# Altium footprint library Molex FFC - FPC Connectors (Through-Hole).PcbLib: 219 footprints (part 10 of 14)
Each footprint in its own frame and in the unit in brackets; x right, y up, seen from the top. Pads: shape width x height; smd on the part's side, far side on the other; paste and mask are expansions set on the pad; w line width, h text height; cw(c..) or ccw(c..) is an arc to the next point about the centre after c.
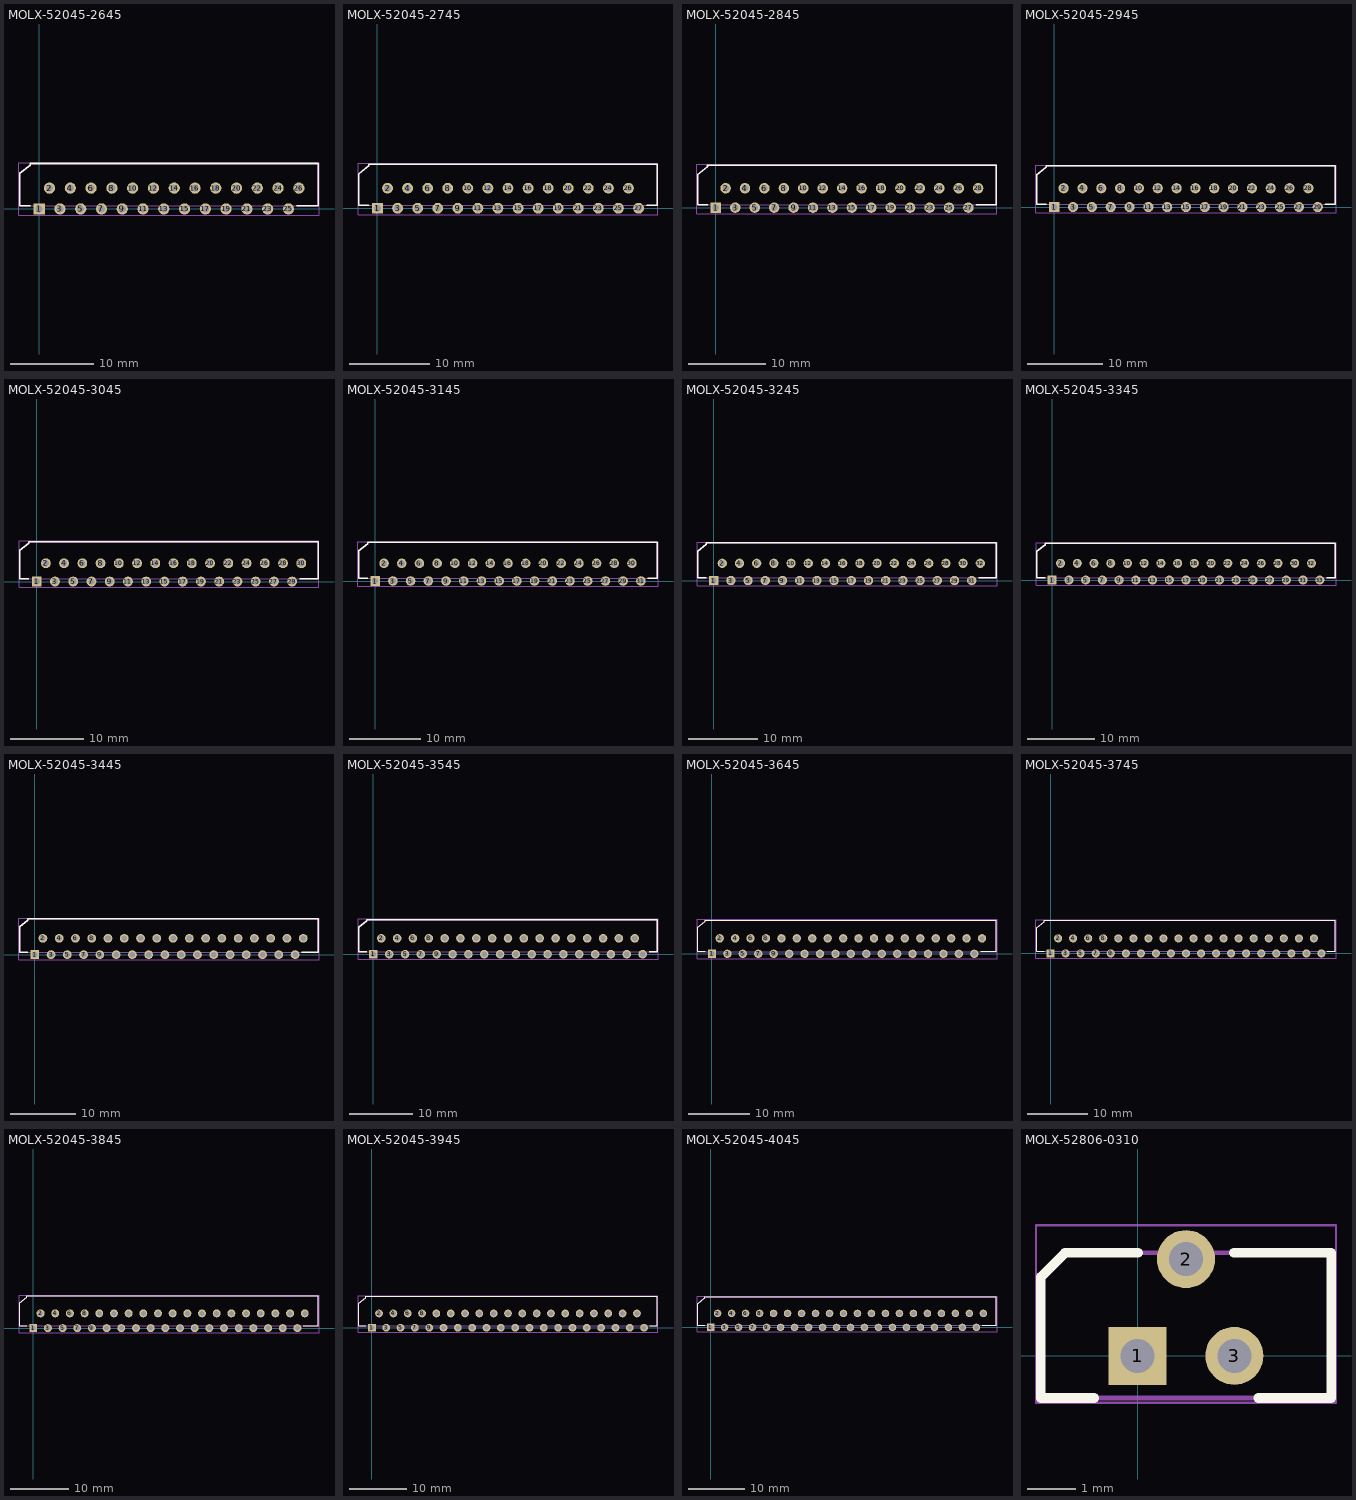
[diagram p9: the footprints below, top view; thin cyan lines are the x and y axes]

## MOLX-52045-2645 [mm] "FFC Connector, 26-Leads, Vertical, Pitch 1.25 mm, Mated Height 8.0 mm, Through Hole"
height 8.012
pads (26):
  rect 1.35x1.35 hole 0.85: 1(0,0)
  round 1.35 hole 0.85: 2(1.25,2.5) 3(2.5,0) 4(3.75,2.5) 5(5,0) 6(6.25,2.5) 7(7.5,0) 8(8.75,2.5) 9(10,0) 10(11.25,2.5) 11(12.5,0) 12(13.75,2.5) 13(15,0) 14(16.25,2.5) 15(17.5,0) 16(18.75,2.5) 17(20,0) 18(21.25,2.5) 19(22.5,0) 20(23.75,2.5) 21(25,0) 22(26.25,2.5) 23(27.5,0) 24(28.75,2.5) 25(30,0) 26(31.25,2.5)
Top Overlay:
  lines w0.2: -1.075,0.375 -2.325,0.375 -2.325,4.275 -1.075,5.275 -1.075,5.475 33.575,5.475 33.575,0.375 31.007,0.375
Mechanical 13:
  lines w0.1: -2.325,0.375 -2.325,4.275 -1.075,5.275 -1.075,5.475 33.575,5.475 33.575,0.375 -2.325,0.375
Mechanical 15:
  lines w0.05: -2.425,-0.775 -2.425,5.575 33.675,5.575 33.675,-0.775 -2.425,-0.775
3D body "520452645.stp": height 8.01, standoff -3.49, extent -2.325,-0.125 33.575,5.475

## MOLX-52045-2745 [mm] "FFC Connector, 27-Leads, Vertical, Pitch 1.25 mm, Mated Height 8.0 mm, Through Hole"
height 8.012
pads (27):
  rect 1.35x1.35 hole 0.85: 1(0,0)
  round 1.35 hole 0.85: 2(1.25,2.5) 3(2.5,0) 4(3.75,2.5) 5(5,0) 6(6.25,2.5) 7(7.5,0) 8(8.75,2.5) 9(10,0) 10(11.25,2.5) 11(12.5,0) 12(13.75,2.5) 13(15,0) 14(16.25,2.5) 15(17.5,0) 16(18.75,2.5) 17(20,0) 18(21.25,2.5) 19(22.5,0) 20(23.75,2.5) 21(25,0) 22(26.25,2.5) 23(27.5,0) 24(28.75,2.5) 25(30,0) 26(31.25,2.5) 27(32.5,0)
Top Overlay:
  lines w0.2: -1.075,0.375 -2.325,0.375 -2.325,4.275 -1.075,5.275 -1.075,5.475 34.825,5.475 34.825,0.375 33.507,0.375
Mechanical 13:
  lines w0.1: -2.325,0.375 -2.325,4.275 -1.075,5.275 -1.075,5.475 34.825,5.475 34.825,0.375 -2.325,0.375
Mechanical 15:
  lines w0.05: -2.425,-0.775 34.925,-0.775 34.925,5.575 -2.425,5.575 -2.425,-0.775
3D body "520452745.stp": height 8.01, standoff -3.49, extent -2.325,-0.125 34.825,5.475

## MOLX-52045-2845 [mm] "FFC Connector, 28-Leads, Vertical, Pitch 1.25 mm, Mated Height 8.0 mm, Through Hole"
height 8.012
pads (28):
  rect 1.35x1.35 hole 0.85: 1(0,0)
  round 1.35 hole 0.85: 2(1.25,2.5) 3(2.5,0) 4(3.75,2.5) 5(5,0) 6(6.25,2.5) 7(7.5,0) 8(8.75,2.5) 9(10,0) 10(11.25,2.5) 11(12.5,0) 12(13.75,2.5) 13(15,0) 14(16.25,2.5) 15(17.5,0) 16(18.75,2.5) 17(20,0) 18(21.25,2.5) 19(22.5,0) 20(23.75,2.5) 21(25,0) 22(26.25,2.5) 23(27.5,0) 24(28.75,2.5) 25(30,0) 26(31.25,2.5) 27(32.5,0) 28(33.75,2.5)
Top Overlay:
  lines w0.2: -1.075,0.375 -2.325,0.375 -2.325,4.275 -1.075,5.275 -1.075,5.475 36.075,5.475 36.075,0.375 33.507,0.375
Mechanical 13:
  lines w0.1: -2.325,0.375 36.075,0.375 36.075,5.475 -1.075,5.475 -1.075,5.275 -2.325,4.275 -2.325,0.375
Mechanical 15:
  lines w0.05: -2.425,-0.775 36.175,-0.775 36.175,5.575 -2.425,5.575 -2.425,-0.775
3D body "520452845.stp": height 8.01, standoff -3.49, extent -2.325,-0.125 36.075,5.475

## MOLX-52045-2945 [mm] "FFC Connector, 29-Leads, Vertical, Pitch 1.25 mm, Mated Height 8.0 mm, Through Hole"
height 8.012
pads (29):
  rect 1.35x1.35 hole 0.85: 1(0,0)
  round 1.35 hole 0.85: 2(1.25,2.5) 3(2.5,0) 4(3.75,2.5) 5(5,0) 6(6.25,2.5) 7(7.5,0) 8(8.75,2.5) 9(10,0) 10(11.25,2.5) 11(12.5,0) 12(13.75,2.5) 13(15,0) 14(16.25,2.5) 15(17.5,0) 16(18.75,2.5) 17(20,0) 18(21.25,2.5) 19(22.5,0) 20(23.75,2.5) 21(25,0) 22(26.25,2.5) 23(27.5,0) 24(28.75,2.5) 25(30,0) 26(31.25,2.5) 27(32.5,0) 28(33.75,2.5) 29(35,0)
Top Overlay:
  lines w0.2: -1.075,0.375 -2.325,0.375 -2.325,4.275 -1.075,5.275 -1.075,5.475 37.325,5.475 37.325,0.375 36.007,0.375
Mechanical 13:
  lines w0.1: -2.325,0.375 37.325,0.375 37.325,5.475 -1.075,5.475 -1.075,5.275 -2.325,4.275 -2.325,0.375
Mechanical 15:
  lines w0.05: -2.425,-0.775 37.425,-0.775 37.425,5.575 -2.425,5.575 -2.425,-0.775
3D body "520452945.stp": height 8.01, standoff -3.49, extent -2.325,-0.125 37.325,5.475

## MOLX-52045-3045 [mm] "FFC Connector, 30-Leads, Vertical, Pitch 1.25 mm, Mated Height 8.0 mm, Through Hole"
height 8.012
pads (30):
  rect 1.35x1.35 hole 0.85: 1(0,0)
  round 1.35 hole 0.85: 2(1.25,2.5) 3(2.5,0) 4(3.75,2.5) 5(5,0) 6(6.25,2.5) 7(7.5,0) 8(8.75,2.5) 9(10,0) 10(11.25,2.5) 11(12.5,0) 12(13.75,2.5) 13(15,0) 14(16.25,2.5) 15(17.5,0) 16(18.75,2.5) 17(20,0) 18(21.25,2.5) 19(22.5,0) 20(23.75,2.5) 21(25,0) 22(26.25,2.5) 23(27.5,0) 24(28.75,2.5) 25(30,0) 26(31.25,2.5) 27(32.5,0) 28(33.75,2.5) 29(35,0) 30(36.25,2.5)
Top Overlay:
  lines w0.2: -1.075,0.375 -2.325,0.375 -2.325,4.275 -1.075,5.275 -1.075,5.475 38.575,5.475 38.575,0.375 36.007,0.375
Mechanical 13:
  lines w0.1: -2.325,0.375 38.575,0.375 38.575,5.475 -1.075,5.475 -1.075,5.275 -2.325,4.275 -2.325,0.375
Mechanical 15:
  lines w0.05: -2.425,-0.775 38.675,-0.775 38.675,5.575 -2.425,5.575 -2.425,-0.775
3D body "520453045.stp": height 8.01, standoff -3.49, extent -2.325,-0.125 38.575,5.475

## MOLX-52045-3145 [mm] "FFC Connector, 31-Leads, Vertical, Pitch 1.25 mm, Mated Height 8.0 mm, Through Hole"
height 8.012
pads (31):
  rect 1.35x1.35 hole 0.85: 1(0,0)
  round 1.35 hole 0.85: 2(1.25,2.5) 3(2.5,0) 4(3.75,2.5) 5(5,0) 6(6.25,2.5) 7(7.5,0) 8(8.75,2.5) 9(10,0) 10(11.25,2.5) 11(12.5,0) 12(13.75,2.5) 13(15,0) 14(16.25,2.5) 15(17.5,0) 16(18.75,2.5) 17(20,0) 18(21.25,2.5) 19(22.5,0) 20(23.75,2.5) 21(25,0) 22(26.25,2.5) 23(27.5,0) 24(28.75,2.5) 25(30,0) 26(31.25,2.5) 27(32.5,0) 28(33.75,2.5) 29(35,0) 30(36.25,2.5) 31(37.5,0)
Top Overlay:
  lines w0.2: -1.075,0.375 -2.325,0.375 -2.325,4.275 -1.075,5.275 -1.075,5.475 39.825,5.475 39.825,0.375 38.507,0.375
Mechanical 13:
  lines w0.1: -2.325,0.375 39.825,0.375 39.825,5.475 -1.075,5.475 -1.075,5.275 -2.325,4.275 -2.325,0.375
Mechanical 15:
  lines w0.05: -2.425,-0.775 39.925,-0.775 39.925,5.575 -2.425,5.575 -2.425,-0.775
3D body "520453145.stp": height 8.01, standoff -3.49, extent -2.325,-0.125 39.825,5.475

## MOLX-52045-3245 [mm] "FFC Connector, 32-Leads, Vertical, Pitch 1.25 mm, Mated Height 8.0 mm, Through Hole"
height 8.012
pads (32):
  rect 1.35x1.35 hole 0.85: 1(0,0)
  round 1.35 hole 0.85: 2(1.25,2.5) 3(2.5,0) 4(3.75,2.5) 5(5,0) 6(6.25,2.5) 7(7.5,0) 8(8.75,2.5) 9(10,0) 10(11.25,2.5) 11(12.5,0) 12(13.75,2.5) 13(15,0) 14(16.25,2.5) 15(17.5,0) 16(18.75,2.5) 17(20,0) 18(21.25,2.5) 19(22.5,0) 20(23.75,2.5) 21(25,0) 22(26.25,2.5) 23(27.5,0) 24(28.75,2.5) 25(30,0) 26(31.25,2.5) 27(32.5,0) 28(33.75,2.5) 29(35,0) 30(36.25,2.5) 31(37.5,0) 32(38.75,2.5)
Top Overlay:
  lines w0.2: -1.075,0.375 -2.325,0.375 -2.325,4.275 -1.075,5.275 -1.075,5.475 41.075,5.475 41.075,0.375 38.507,0.375
Mechanical 13:
  lines w0.1: -1.075,5.275 -1.075,5.475 41.075,5.475 41.075,0.375 -2.325,0.375 -2.325,4.275 -1.075,5.275
Mechanical 15:
  lines w0.05: -2.425,-0.775 -2.425,5.575 41.175,5.575 41.175,-0.775 -2.425,-0.775
3D body "520453245.stp": height 8.01, standoff -3.49, extent -2.325,-0.125 41.075,5.475

## MOLX-52045-3345 [mm] "FFC Connector, 33-Leads, Vertical, Pitch 1.25 mm, Mated Height 8.0 mm, Through Hole"
height 8.012
pads (33):
  rect 1.35x1.35 hole 0.85: 1(0,0)
  round 1.35 hole 0.85: 2(1.25,2.5) 3(2.5,0) 4(3.75,2.5) 5(5,0) 6(6.25,2.5) 7(7.5,0) 8(8.75,2.5) 9(10,0) 10(11.25,2.5) 11(12.5,0) 12(13.75,2.5) 13(15,0) 14(16.25,2.5) 15(17.5,0) 16(18.75,2.5) 17(20,0) 18(21.25,2.5) 19(22.5,0) 20(23.75,2.5) 21(25,0) 22(26.25,2.5) 23(27.5,0) 24(28.75,2.5) 25(30,0) 26(31.25,2.5) 27(32.5,0) 28(33.75,2.5) 29(35,0) 30(36.25,2.5) 31(37.5,0) 32(38.75,2.5) 33(40,0)
Top Overlay:
  lines w0.2: -1.075,0.375 -2.325,0.375 -2.325,4.275 -1.075,5.275 -1.075,5.475 42.325,5.475 42.325,0.375 41.007,0.375
Mechanical 13:
  lines w0.1: -1.075,5.275 -1.075,5.475 42.325,5.475 42.325,0.375 -2.325,0.375 -2.325,4.275 -1.075,5.275
Mechanical 15:
  lines w0.05: -2.425,-0.775 42.425,-0.775 42.425,5.575 -2.425,5.575 -2.425,-0.775
3D body "520453345.stp": height 8.01, standoff -3.49, extent -2.325,-0.125 42.325,5.475

## MOLX-52045-3445 [mm] "FFC Connector, 34-Leads, Vertical, Pitch 1.25 mm, Mated Height 8.0 mm, Through Hole"
height 8.012
pads (34):
  rect 1.35x1.35 hole 0.85: 1(0,0)
  round 1.35 hole 0.85: 2(1.25,2.5) 3(2.5,0) 4(3.75,2.5) 5(5,0) 6(6.25,2.5) 7(7.5,0) 8(8.75,2.5) 9(10,0) 10(11.25,2.5) 11(12.5,0) 12(13.75,2.5) 13(15,0) 14(16.25,2.5) 15(17.5,0) 16(18.75,2.5) 17(20,0) 18(21.25,2.5) 19(22.5,0) 20(23.75,2.5) 21(25,0) 22(26.25,2.5) 23(27.5,0) 24(28.75,2.5) 25(30,0) 26(31.25,2.5) 27(32.5,0) 28(33.75,2.5) 29(35,0) 30(36.25,2.5) 31(37.5,0) 32(38.75,2.5) 33(40,0) 34(41.25,2.5)
Top Overlay:
  lines w0.2: -1.075,0.375 -2.325,0.375 -2.325,4.275 -1.075,5.275 -1.075,5.475 43.575,5.475 43.575,0.375 41.007,0.375
Mechanical 13:
  lines w0.1: -1.075,5.275 -1.075,5.475 43.575,5.475 43.575,0.375 -2.325,0.375 -2.325,4.275 -1.075,5.275
Mechanical 15:
  lines w0.05: -2.425,-0.775 -2.425,5.575 43.675,5.575 43.675,-0.775 -2.425,-0.775
3D body "520453445.stp": height 8.01, standoff -3.49, extent -2.325,-0.125 43.575,5.475

## MOLX-52045-3545 [mm] "FFC Connector, 35-Leads, Vertical, Pitch 1.25 mm, Mated Height 8.0 mm, Through Hole"
height 8.012
pads (35):
  rect 1.35x1.35 hole 0.85: 1(0,0)
  round 1.35 hole 0.85: 2(1.25,2.5) 3(2.5,0) 4(3.75,2.5) 5(5,0) 6(6.25,2.5) 7(7.5,0) 8(8.75,2.5) 9(10,0) 10(11.25,2.5) 11(12.5,0) 12(13.75,2.5) 13(15,0) 14(16.25,2.5) 15(17.5,0) 16(18.75,2.5) 17(20,0) 18(21.25,2.5) 19(22.5,0) 20(23.75,2.5) 21(25,0) 22(26.25,2.5) 23(27.5,0) 24(28.75,2.5) 25(30,0) 26(31.25,2.5) 27(32.5,0) 28(33.75,2.5) 29(35,0) 30(36.25,2.5) 31(37.5,0) 32(38.75,2.5) 33(40,0) 34(41.25,2.5) 35(42.5,0)
Top Overlay:
  lines w0.2: -1.075,0.375 -2.325,0.375 -2.325,4.275 -1.075,5.275 -1.075,5.475 44.825,5.475 44.825,0.375 43.507,0.375
Mechanical 13:
  lines w0.1: -1.075,5.275 -1.075,5.475 44.825,5.475 44.825,0.375 -2.325,0.375 -2.325,4.275 -1.075,5.275
Mechanical 15:
  lines w0.05: -2.425,-0.775 44.925,-0.775 44.925,5.575 -2.425,5.575 -2.425,-0.775
3D body "520453545.stp": height 8.01, standoff -3.49, extent -2.325,-0.125 44.825,5.475

## MOLX-52045-3645 [mm] "FFC Connector, 36-Leads, Vertical, Pitch 1.25 mm, Mated Height 8.0 mm, Through Hole"
height 8.012
pads (36):
  rect 1.35x1.35 hole 0.85: 1(0,0)
  round 1.35 hole 0.85: 2(1.25,2.5) 3(2.5,0) 4(3.75,2.5) 5(5,0) 6(6.25,2.5) 7(7.5,0) 8(8.75,2.5) 9(10,0) 10(11.25,2.5) 11(12.5,0) 12(13.75,2.5) 13(15,0) 14(16.25,2.5) 15(17.5,0) 16(18.75,2.5) 17(20,0) 18(21.25,2.5) 19(22.5,0) 20(23.75,2.5) 21(25,0) 22(26.25,2.5) 23(27.5,0) 24(28.75,2.5) 25(30,0) 26(31.25,2.5) 27(32.5,0) 28(33.75,2.5) 29(35,0) 30(36.25,2.5) 31(37.5,0) 32(38.75,2.5) 33(40,0) 34(41.25,2.5) 35(42.5,0) 36(43.75,2.5)
Top Overlay:
  lines w0.2: -1.075,0.375 -2.325,0.375 -2.325,4.275 -1.075,5.275 -1.075,5.475 46.075,5.475 46.075,0.375 43.507,0.375
Mechanical 13:
  lines w0.1: -1.075,5.275 -1.075,5.475 46.075,5.475 46.075,0.375 -2.325,0.375 -2.325,4.275 -1.075,5.275
Mechanical 15:
  lines w0.05: -2.425,-0.775 -2.425,5.575 46.175,5.575 46.175,-0.775 -2.425,-0.775
3D body "520453645.stp": height 8.01, standoff -3.49, extent -2.325,-0.125 46.075,5.475

## MOLX-52045-3745 [mm] "FFC Connector, 37-Leads, Vertical, Pitch 1.25 mm, Mated Height 8.0 mm, Through Hole"
height 8
pads (37):
  rect 1.35x1.35 hole 0.85: 1(0,0)
  round 1.35 hole 0.85: 2(1.25,2.5) 3(2.5,0) 4(3.75,2.5) 5(5,0) 6(6.25,2.5) 7(7.5,0) 8(8.75,2.5) 9(10,0) 10(11.25,2.5) 11(12.5,0) 12(13.75,2.5) 13(15,0) 14(16.25,2.5) 15(17.5,0) 16(18.75,2.5) 17(20,0) 18(21.25,2.5) 19(22.5,0) 20(23.75,2.5) 21(25,0) 22(26.25,2.5) 23(27.5,0) 24(28.75,2.5) 25(30,0) 26(31.25,2.5) 27(32.5,0) 28(33.75,2.5) 29(35,0) 30(36.25,2.5) 31(37.5,0) 32(38.75,2.5) 33(40,0) 34(41.25,2.5) 35(42.5,0) 36(43.75,2.5) 37(45,0)
Top Overlay:
  lines w0.2: -1.075,0.375 -2.325,0.375 -2.325,4.275 -1.075,5.275 -1.075,5.475 47.325,5.475 47.325,0.375 46.008,0.375
Mechanical 13:
  lines w0.1: -2.325,0.375 -2.325,4.275 -1.075,5.275 -1.075,5.475 47.325,5.475 47.325,0.375 -2.325,0.375
Mechanical 15:
  lines w0.05: -2.425,-0.775 47.425,-0.775 47.425,5.575 -2.425,5.575 -2.425,-0.775
3D body "520453745.stp": height 8, standoff -3.49, extent -2.325,-0.125 47.325,5.475

## MOLX-52045-3845 [mm] "FFC Connector, 38-Leads, Vertical, Pitch 1.25 mm, Mated Height 8.0 mm, Through Hole"
height 8.012
pads (38):
  rect 1.35x1.35 hole 0.85: 1(0,0)
  round 1.35 hole 0.85: 2(1.25,2.5) 3(2.5,0) 4(3.75,2.5) 5(5,0) 6(6.25,2.5) 7(7.5,0) 8(8.75,2.5) 9(10,0) 10(11.25,2.5) 11(12.5,0) 12(13.75,2.5) 13(15,0) 14(16.25,2.5) 15(17.5,0) 16(18.75,2.5) 17(20,0) 18(21.25,2.5) 19(22.5,0) 20(23.75,2.5) 21(25,0) 22(26.25,2.5) 23(27.5,0) 24(28.75,2.5) 25(30,0) 26(31.25,2.5) 27(32.5,0) 28(33.75,2.5) 29(35,0) 30(36.25,2.5) 31(37.5,0) 32(38.75,2.5) 33(40,0) 34(41.25,2.5) 35(42.5,0) 36(43.75,2.5) 37(45,0) 38(46.25,2.5)
Top Overlay:
  lines w0.2: -1.075,0.375 -2.325,0.375 -2.325,4.275 -1.075,5.275 -1.075,5.475 48.575,5.475 48.575,0.375 46.007,0.375
Mechanical 13:
  lines w0.1: -1.075,5.275 -1.075,5.475 48.575,5.475 48.575,0.375 -2.325,0.375 -2.325,4.275 -1.075,5.275
Mechanical 15:
  lines w0.05: -2.425,-0.775 48.675,-0.775 48.675,5.575 -2.425,5.575 -2.425,-0.775
3D body "520453845.stp": height 8.01, standoff -3.49, extent -2.325,-0.125 48.575,5.475

## MOLX-52045-3945 [mm] "FFC Connector, 39-Leads, Vertical, Pitch 1.25 mm, Mated Height 8.0 mm, Through Hole"
height 8.012
pads (39):
  rect 1.35x1.35 hole 0.85: 1(0,0)
  round 1.35 hole 0.85: 2(1.25,2.5) 3(2.5,0) 4(3.75,2.5) 5(5,0) 6(6.25,2.5) 7(7.5,0) 8(8.75,2.5) 9(10,0) 10(11.25,2.5) 11(12.5,0) 12(13.75,2.5) 13(15,0) 14(16.25,2.5) 15(17.5,0) 16(18.75,2.5) 17(20,0) 18(21.25,2.5) 19(22.5,0) 20(23.75,2.5) 21(25,0) 22(26.25,2.5) 23(27.5,0) 24(28.75,2.5) 25(30,0) 26(31.25,2.5) 27(32.5,0) 28(33.75,2.5) 29(35,0) 30(36.25,2.5) 31(37.5,0) 32(38.75,2.5) 33(40,0) 34(41.25,2.5) 35(42.5,0) 36(43.75,2.5) 37(45,0) 38(46.25,2.5) 39(47.5,0)
Top Overlay:
  lines w0.2: -1.075,0.375 -2.325,0.375 -2.325,4.275 -1.075,5.275 -1.075,5.475 49.825,5.475 49.825,0.375 48.507,0.375
Mechanical 13:
  lines w0.1: -1.075,5.275 -1.075,5.475 49.825,5.475 49.825,0.375 -2.325,0.375 -2.325,4.275 -1.075,5.275
Mechanical 15:
  lines w0.05: -2.425,-0.775 -2.425,5.575 49.925,5.575 49.925,-0.775 -2.425,-0.775
3D body "520453945.stp": height 8.01, standoff -3.49, extent -2.325,-0.125 49.825,5.475

## MOLX-52045-4045 [mm] "FFC Connector, 40-Leads, Vertical, Pitch 1.25 mm, Mated Height 8.0 mm, Through Hole"
height 8.012
pads (40):
  rect 1.35x1.35 hole 0.85: 1(0,0)
  round 1.35 hole 0.85: 2(1.25,2.5) 3(2.5,0) 4(3.75,2.5) 5(5,0) 6(6.25,2.5) 7(7.5,0) 8(8.75,2.5) 9(10,0) 10(11.25,2.5) 11(12.5,0) 12(13.75,2.5) 13(15,0) 14(16.25,2.5) 15(17.5,0) 16(18.75,2.5) 17(20,0) 18(21.25,2.5) 19(22.5,0) 20(23.75,2.5) 21(25,0) 22(26.25,2.5) 23(27.5,0) 24(28.75,2.5) 25(30,0) 26(31.25,2.5) 27(32.5,0) 28(33.75,2.5) 29(35,0) 30(36.25,2.5) 31(37.5,0) 32(38.75,2.5) 33(40,0) 34(41.25,2.5) 35(42.5,0) 36(43.75,2.5) 37(45,0) 38(46.25,2.5) 39(47.5,0) 40(48.75,2.5)
Top Overlay:
  lines w0.2: -1.075,0.375 -2.325,0.375 -2.325,4.275 -1.075,5.275 -1.075,5.475 51.075,5.475 51.075,0.375 48.507,0.375
Mechanical 13:
  lines w0.1: -1.075,5.275 -1.075,5.475 51.075,5.475 ; -1.075,5.275 -2.325,4.275 -2.325,0.375 51.075,0.375 51.075,5.475
Mechanical 15:
  lines w0.05: -2.425,-0.775 -2.425,5.575 51.175,5.575 51.175,-0.775 -2.425,-0.775
3D body "520454045.stp": height 8.01, standoff -3.49, extent -2.325,-0.125 51.075,5.475

## MOLX-52806-0310 [mm] "FFC Connector, 3-Leads, Vertical, Pitch 1.0 mm, Mated Height 5.4 mm, Through Hole"
height 5.412
pads (3):
  rect 1.2x1.2 hole 0.7: 1(0,0)
  round 1.2 hole 0.7: 2(1,2) 3(2,0)
Top Overlay:
  lines w0.2: -0.896,-0.87 -2,-0.87 -2,1.63 -1.5,2.13 0.008,2.13 ; 1.992,2.13 4,2.13 4,-0.87 2.494,-0.87
Mechanical 13:
  lines w0.1: -2,-0.87 4,-0.87 4,2.13 -1.5,2.13 -2,1.63 -2,-0.87
Mechanical 15:
  lines w0.05: -2.1,-0.97 -2.1,2.7 4.1,2.7 4.1,-0.97 -2.1,-0.97
3D body "52806-0310.stp": height 5.41, standoff -3.19, extent -2,-0.87 4,2.13